# Altium footprint library SYB.PcbLib.PcbLib: 89 footprints (part 4 of 6)
Each footprint in its own frame and in the unit in brackets; x right, y up, seen from the top. Pads: shape width x height; smd on the part's side, far side on the other; paste and mask are expansions set on the pad; w line width, h text height; cw(c..) or ccw(c..) is an arc to the next point about the centre after c.
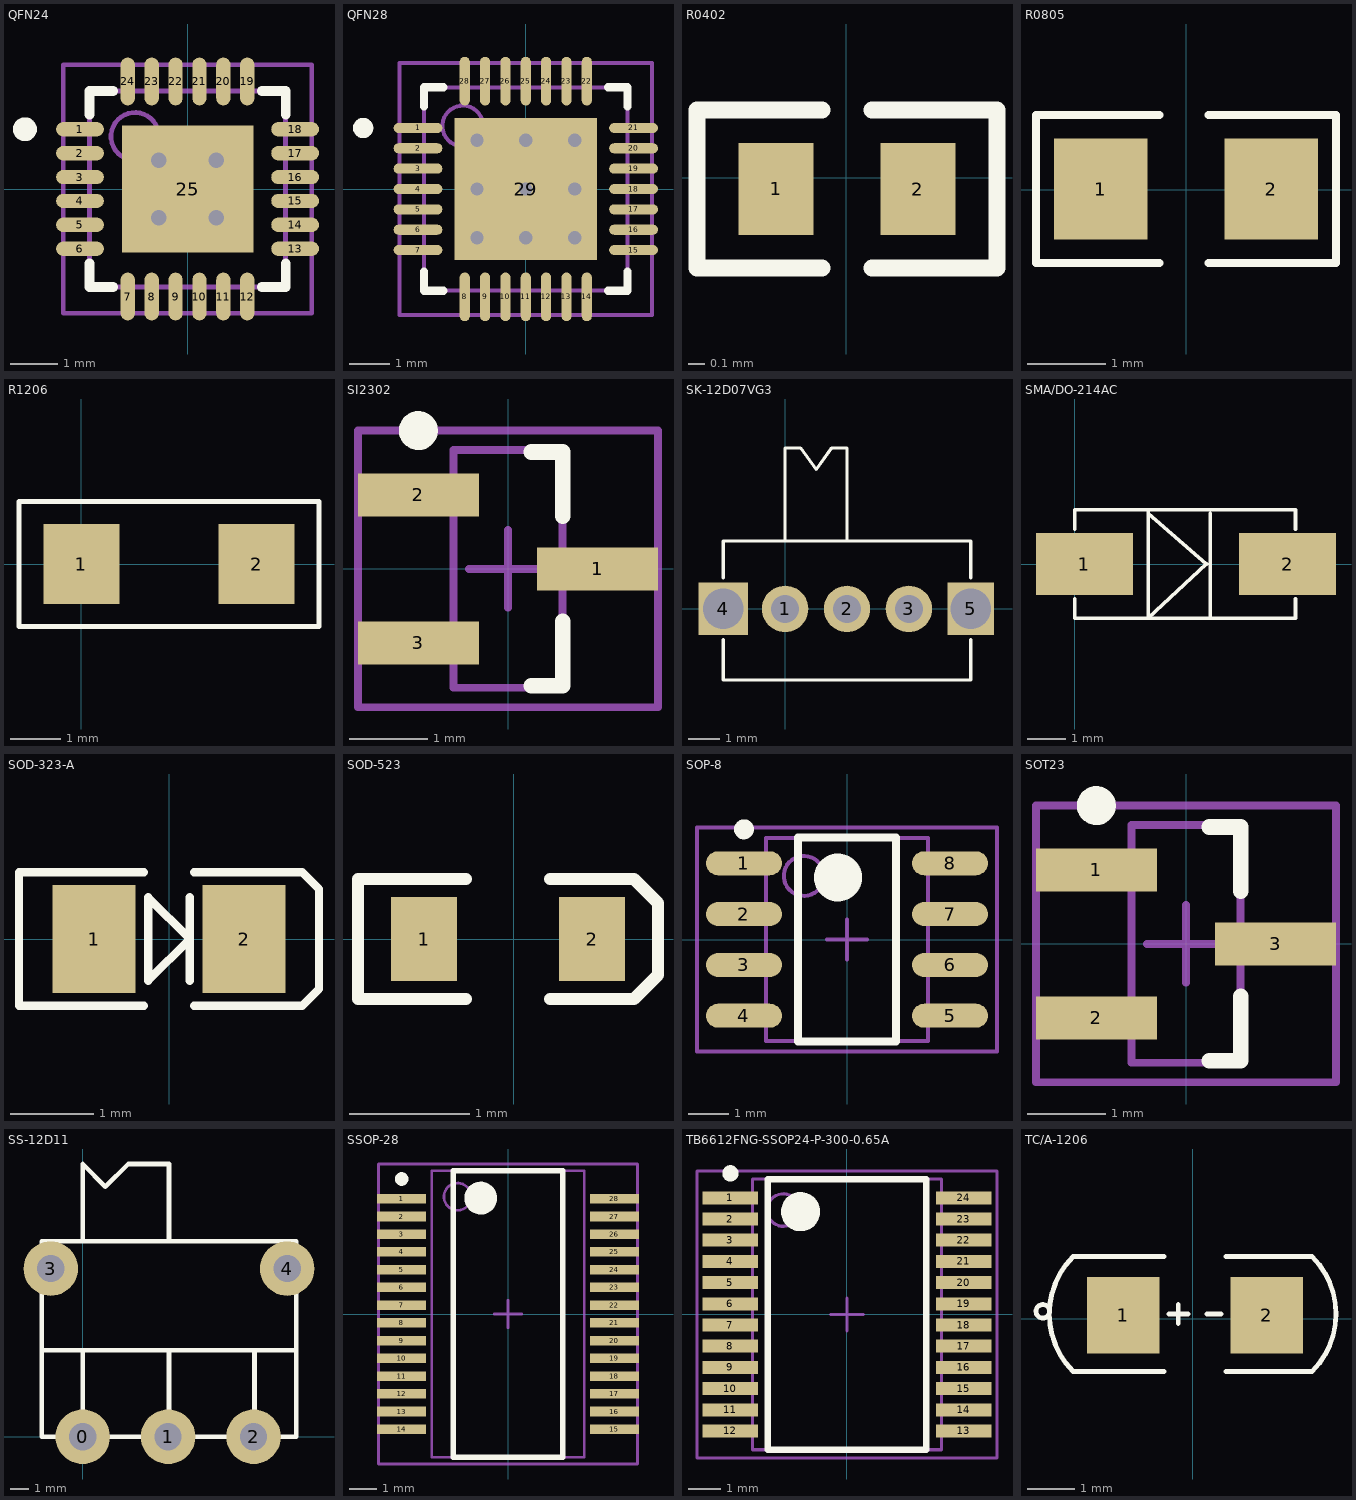
[diagram p3: the footprints below, top view; thin cyan lines are the x and y axes]

## QFN24 [mm]
height 0.95
pads (25):
  oval 1x0.3 smd: 1(-2.25,1.25) 2(-2.25,0.75) 3(-2.25,0.25) 4(-2.25,-0.25) 5(-2.25,-0.75) 6(-2.25,-1.25) 13(2.25,-1.25) 14(2.25,-0.75) 15(2.25,-0.25) 16(2.25,0.25) 17(2.25,0.75) 18(2.25,1.25)
  oval 0.3x1 smd: 7(-1.25,-2.25) 8(-0.75,-2.25) 9(-0.25,-2.25) 10(0.25,-2.25) 11(0.75,-2.25) 12(1.25,-2.25) 19(1.25,2.25) 20(0.75,2.25) 21(0.25,2.25) 22(-0.25,2.25) 23(-0.75,2.25) 24(-1.25,2.25)
  rect 2.75x2.65 smd: 25(0,0)
via -0.6,0.6 diameter 0.66 hole 0.33
via 0.6,0.6 diameter 0.66 hole 0.33
via -0.6,-0.6 diameter 0.66 hole 0.33
via 0.6,-0.6 diameter 0.66 hole 0.33
Top Overlay:
  circle w0.25: c-3.4,1.25 r0.125
  lines w0.2: -2.05,-1.55 -2.05,-2.05 -1.55,-2.05 ; -2.05,1.55 -2.05,2.05 -1.55,2.05 ; 1.55,-2.05 2.05,-2.05 2.05,-1.55 ; 1.55,2.05 2.05,2.05 2.05,1.55
Mechanical 13:
  circle w0.1: c-1.1,1.1 r0.5
  lines w0.1: -2.05,-2.05 -2.05,2.05 2.05,2.05 2.05,-2.05 -2.05,-2.05
Mechanical 15:
  lines w0.1: -0.5,0 0.5,0 ; 0,-0.5 0,0.5 ; -2.6,-2.6 -2.6,2.6 2.6,2.6 2.6,-2.6 -2.6,-2.6
3D body: height 0.95, standoff 0, extent -2.05,-2.05 2.05,2.05

## QFN28 [mm] "QFN, 28-Leads, Body 5.0x5.0mm (max), Pitch 0.50mm, IPC Medium Density"
height 0.9
pads (29):
  oval 1.2x0.25 smd: 1(-2.65,1.5) 2(-2.65,1) 3(-2.65,0.5) 4(-2.65,0) 5(-2.65,-0.5) 6(-2.65,-1) 7(-2.65,-1.5) 15(2.65,-1.5) 16(2.65,-1) 17(2.65,-0.5) 18(2.65,0) 19(2.65,0.5) 20(2.65,1) 21(2.65,1.5)
  oval 0.25x1.2 smd: 8(-1.5,-2.65) 9(-1,-2.65) 10(-0.5,-2.65) 11(0,-2.65) 12(0.5,-2.65) 13(1,-2.65) 14(1.5,-2.65) 22(1.5,2.65) 23(1,2.65) 24(0.5,2.65) 25(0,2.65) 26(-0.5,2.65) 27(-1,2.65) 28(-1.5,2.65)
  rect 3.5x3.5 smd: 29(0,0)
via -1.2,1.2 diameter 0.66 hole 0.33
via 0,1.2 diameter 0.66 hole 0.33
via 1.2,1.2 diameter 0.66 hole 0.33
via -1.2,0 diameter 0.66 hole 0.33
via 0,0 diameter 0.66 hole 0.33
via 1.2,0 diameter 0.66 hole 0.33
via -1.2,-1.2 diameter 0.66 hole 0.33
via 0,-1.2 diameter 0.66 hole 0.33
via 1.2,-1.2 diameter 0.66 hole 0.33
Top Overlay:
  circle w0.25: c-4,1.5 r0.125
  lines w0.2: -2.5,-2.025 -2.5,-2.5 -2.025,-2.5 ; -2.5,2.025 -2.5,2.5 -2.025,2.5 ; 2.025,-2.5 2.5,-2.5 2.5,-2.025 ; 2.025,2.5 2.5,2.5 2.5,2.025
Mechanical 13:
  circle w0.1: c-1.55,1.55 r0.5
  lines w0.1: -2.5,-2.5 -2.5,2.5 2.5,2.5 2.5,-2.5 -2.5,-2.5
Mechanical 15:
  lines w0.1: -0.5,0 0.5,0 ; 0,-0.5 0,0.5 ; -3.1,-3.1 -3.1,3.1 3.1,3.1 3.1,-3.1 -3.1,-3.1
3D body: height 0.9, standoff 0.02, extent -2.5,-2.5 2.5,2.5

## R0402 [mm]
pads (2):
  rect 0.45x0.55 smd: 1(-0.42,-0.066) 2(0.43,-0.067)
Top Overlay:
  lines w0.102: -0.145,-0.542 -0.895,-0.542 -0.895,0.408 -0.145,0.408 ; 0.155,-0.542 0.905,-0.542 0.905,0.408 0.155,0.408
3D body: height 0.3, standoff 0, extent 0.305,-0.316 0.505,0.183
3D body: height 0.3, standoff 0, extent -0.295,-0.306 0.305,0.173
3D body: height 0.3, standoff 0, extent -0.495,-0.316 -0.295,0.183
3D body: height 0.3, standoff 0, extent -0.295,-0.316 0.305,-0.306
3D body: height 0.3, standoff 0, extent -0.295,0.173 0.305,0.183

## R0805 [mm]
height 2
pads (2):
  rect 1.2x1.3 smd: 1(-1.093,0.007) 2(1.093,0.007)
Top Overlay:
  lines w0.102: -0.338,-0.943 -1.925,-0.943 -1.925,0.957 -0.338,0.957 ; 0.288,-0.943 1.925,-0.943 1.925,0.957 0.288,0.957
3D body: height 0.8, standoff 0.02, extent -1,-0.6 1,0.65

## R1206 [mm]
pads (2):
  rect 1.52x1.6 smd: 1(0,0) 2(3.5,0)
Top Overlay:
  lines w0.1: -1.25,-1.25 4.75,-1.25 4.75,1.25 -1.25,1.25 -1.25,-1.25
3D body: height 1, standoff 0, extent 0.15,-0.8 3.35,0.8

## SI2302 [mm]
pads (3):
  rect 1.55x0.55 smd: 1(1.15,0) 2(-1.15,0.95) 3(-1.15,-0.95)
Top Overlay:
  circle w0.25: c-1.15,1.775 r0.125
  lines w0.2: 0.3,-1.5 0.7,-1.5 0.7,-0.675 ; 0.3,1.5 0.7,1.5 0.7,0.675
Mechanical 13:
  lines w0.1: -0.7,-1.525 -0.7,1.525 0.7,1.525 0.7,-1.525 -0.7,-1.525
Mechanical 15:
  lines w0.1: -0.5,0 0.5,0 ; 0,-0.5 0,0.5 ; -1.925,-1.775 -1.925,1.775 1.925,1.775 1.925,-1.775 -1.925,-1.775
3D body: height 1.3, standoff 0, extent -1.4,-1.45 1.4,1.45

## SK-12D07VG3 [mm] "拨动开关-F2.0"
pads (5):
  round 1.5 hole 0.9: 1(0,0) 2(2,0) 3(4,0)
  rect 1.6x1.7 hole 1.3: 4(-2,0)
  rect 1.5x1.7 hole 1.3: 5(6,0)
Top Overlay:
  lines w0.1: -2,-1 -2,-2.3 6,-2.3 6,-1 ; -2,1 -2,2.2 6,2.2 6,1 ; 0,2.2 0,5.2 0.5,5.2 1,4.5 1.5,5.2 2,5.2 2,2.2

## SMA/DO-214AC [mm] "SMA/DO-214AC"
pads (2):
  rect 2.5x1.6 smd: 1(0.25,0) 2(5.5,0)
Top Overlay:
  lines w0.1: 0,-0.9 0,-1.4 5.7,-1.4 5.7,-0.9 ; 0,0.9 0,1.4 5.7,1.4 5.7,0.9 ; 1.9,1.3 3.4,0 1.9,-1.4 1.9,1.4 ; 3.5,-1.4 3.5,1.3
3D body: height 2.6, standoff 0.03, extent 0.1,-1.45 5.6,1.35

## SOD-323-A [mm]
pads (2):
  rect 1x1.3 smd: 1(-0.9,0) 2(0.9,0)
Top Overlay:
  lines w0.1: -0.3,-0.8 -1.8,-0.8 -1.8,0.2 -1.8,0.8 -0.3,0.8 ; 0.25,-0.5 0.25,0.5 ; 0.3,-0.8 1.6,-0.8 1.8,-0.6 1.8,0.6 1.6,0.8 0.3,0.8 ; -0.25,-0.5 0.25,0 -0.25,0.5 -0.25,-0.5

## SOD-523 [mm]
pads (2):
  rect 0.55x0.7 smd: 1(-0.75,0) 2(0.65,0)
Top Overlay:
  lines w0.1: -0.4,-0.5 -1.3,-0.5 -1.3,0.25 -1.3,0.5 -0.4,0.5 ; 0.3,-0.5 1,-0.5 1.2,-0.3 1.2,0.3 1,0.5 0.3,0.5

## SOP-8 [mm] "BQ2057W"
height 1.78
pads (8):
  oval 1.9x0.6 smd: 1(-2.575,1.905) 2(-2.575,0.635) 3(-2.575,-0.635) 4(-2.575,-1.905) 5(2.575,-1.905) 6(2.575,-0.635) 7(2.575,0.635) 8(2.575,1.905)
Top Overlay:
  circle w0.25: c-2.575,2.755 r0.125
  circle w0.6: c-0.225,1.55 r0.3
  lines w0.2: -1.225,-2.55 -1.225,2.55 1.225,2.55 1.225,-2.55 -1.225,-2.55
Mechanical 13:
  circle w0.1: c-1.08,1.59 r0.5
  lines w0.1: -2.03,-2.54 -2.03,2.54 2.03,2.54 2.03,-2.54 -2.03,-2.54
Mechanical 15:
  lines w0.1: -0.5,0 0.5,0 ; 0,-0.5 0,0.5 ; -3.75,-2.8 -3.75,2.8 3.75,2.8 3.75,-2.8 -3.75,-2.8
3D body: height 1.78, standoff 0.1, extent -2.03,-2.54 2.03,2.54

## SOT23 [mm] "SOT23"
height 1.1
pads (3):
  rect 1.55x0.55 smd: 1(-1.15,0.95) 2(-1.15,-0.95) 3(1.15,0)
Top Overlay:
  circle w0.25: c-1.15,1.775 r0.125
  lines w0.2: 0.3,-1.5 0.7,-1.5 0.7,-0.675 ; 0.3,1.5 0.7,1.5 0.7,0.675
Mechanical 13:
  lines w0.1: -0.7,-1.525 0.7,-1.525 0.7,1.525 -0.7,1.525 -0.7,-1.525
Mechanical 15:
  lines w0.1: -0.5,0 0.5,0 ; 0,-0.5 0,0.5 ; -1.925,-1.775 1.925,-1.775 1.925,1.775 -1.925,1.775 -1.925,-1.775
3D body: height 1.3, standoff 0, extent -1.4,-1.45 1.4,1.45

## SS-12D11 [mm]
pads (5):
  round 3 hole 1.5: 0(0,0) 1(4.7,0) 2(9.4,0) 3(-1.75,9.25) 4(11.25,9.25)
Top Overlay:
  lines w0.254: -2.25,4.75 11.75,4.75 ; 0,0 0,4.7 ; 0,10.75 0,15 1.25,13.75 2.5,15 4.75,15 4.75,10.75 ; 4.75,0 4.75,4.7 ; 9.45,0 9.45,4.7 ; -2.25,0 -2.25,10.75 11.75,10.75 11.75,0 -2.25,0

## SSOP-28 [mm]
height 2
pads (28):
  rect 1.8x0.35 smd: 1(-3.9,4.225) 2(-3.9,3.575) 3(-3.9,2.925) 4(-3.9,2.275) 5(-3.9,1.625) 6(-3.9,0.975) 7(-3.9,0.325) 8(-3.9,-0.325) 9(-3.9,-0.975) 10(-3.9,-1.625) 11(-3.9,-2.275) 12(-3.9,-2.925) 13(-3.9,-3.575) 14(-3.9,-4.225) 15(3.9,-4.225) 16(3.9,-3.575) 17(3.9,-2.925) 18(3.9,-2.275) 19(3.9,-1.625) 20(3.9,-0.975) 21(3.9,-0.325) 22(3.9,0.325) 23(3.9,0.975) 24(3.9,1.625) 25(3.9,2.275) 26(3.9,2.925) 27(3.9,3.575) 28(3.9,4.225)
Top Overlay:
  circle w0.25: c-3.9,4.95 r0.125
  circle w0.6: c-1,4.25 r0.3
  lines w0.2: -2,-5.25 -2,5.25 2,5.25 2,-5.25 -2,-5.25
Mechanical 13:
  circle w0.1: c-1.85,4.3 r0.5
  lines w0.1: -2.8,-5.25 -2.8,5.25 2.8,5.25 2.8,-5.25 -2.8,-5.25
Mechanical 15:
  lines w0.1: -0.5,0 0.5,0 ; 0,-0.5 0,0.5 ; -4.75,-5.5 -4.75,5.5 4.75,5.5 4.75,-5.5 -4.75,-5.5
3D body: height 1.95, standoff -0.05, extent -3.9,-5.1 3.912,5.1

## TB6612FNG-SSOP24-P-300-0.65A [mm] "TB6612FNG"
height 1.6
pads (24):
  rect 1.7x0.4 smd: 1(-3.575,3.575) 2(-3.575,2.925) 3(-3.575,2.275) 4(-3.575,1.625) 5(-3.575,0.975) 6(-3.575,0.325) 7(-3.575,-0.325) 8(-3.575,-0.975) 9(-3.575,-1.625) 10(-3.575,-2.275) 11(-3.575,-2.925) 12(-3.575,-3.575) 13(3.575,-3.575) 14(3.575,-2.925) 15(3.575,-2.275) 16(3.575,-1.625) 17(3.575,-0.975) 18(3.575,-0.325) 19(3.575,0.325) 20(3.575,0.975) 21(3.575,1.625) 22(3.575,2.275) 23(3.575,2.925) 24(3.575,3.575)
Top Overlay:
  circle w0.25: c-3.575,4.325 r0.125
  circle w0.6: c-1.425,3.15 r0.3
  lines w0.2: -2.425,-4.15 -2.425,4.15 2.425,4.15 2.425,-4.15 -2.425,-4.15
Mechanical 13:
  circle w0.1: c-1.95,3.2 r0.5
  lines w0.1: -2.9,-4.15 -2.9,4.15 2.9,4.15 2.9,-4.15 -2.9,-4.15
Mechanical 15:
  lines w0.1: -0.5,0 0.5,0 ; 0,-0.5 0,0.5 ; -4.6,-4.4 -4.6,4.4 4.6,4.4 4.6,-4.4 -4.6,-4.4
3D body: height 1.98, standoff -0.01, extent -3.95,-4.3 3.95,4.33

## TC/A-1206 [mm]
pads (2):
  rect 1.52x1.6 smd: 1(-1.45,0.075) 2(1.55,0.075)
Top Overlay:
  lines w0.1: -3.008,0.219 ccw(c-3.134,0.155) -3,0.2 ; -0.6,-1.1 -2.5,-1.1 cw(c-1.3,0.1) -2.5,1.3 -0.6,1.3 ; -0.5,0.1 -0.1,0.1 ; -0.3,-0.1 -0.3,0.3 ; 0.3,0.1 0.6,0.1 ; 0.7,-1.1 2.5,-1.1 ccw(c1.3,0.1) 2.5,1.3 0.7,1.3
3D body: height 1.57, standoff -0.03, extent -1.55,-0.725 1.624,0.875